# Altium footprint library Wurth_Elektronik_Electromechanic_Wire_to_Board_Connectors_rev16a.PCBLIB: 662 footprints (part 7 of 42)
Each footprint in its own frame and in the unit in brackets; x right, y up, seen from the top. Pads: shape width x height; smd on the part's side, far side on the other; paste and mask are expansions set on the pad; w line width, h text height; cw(c..) or ccw(c..) is an arc to the next point about the centre after c.
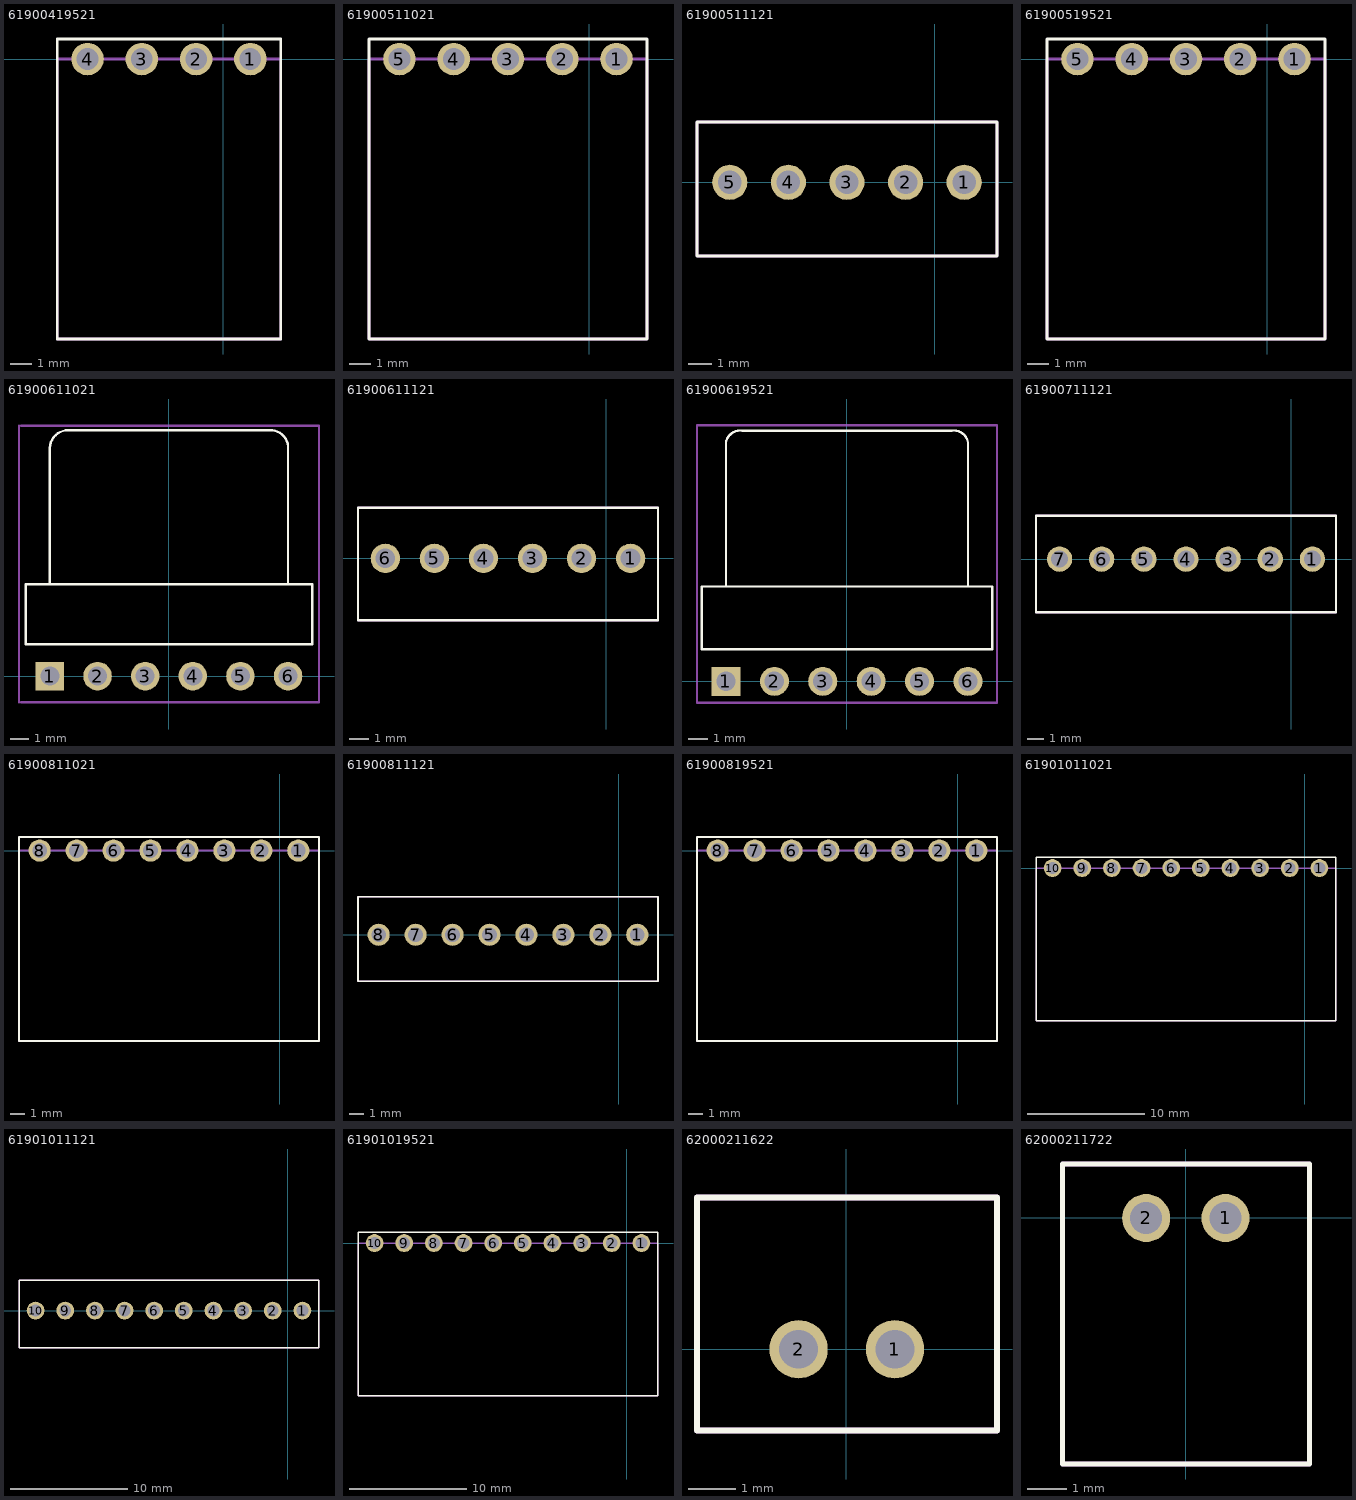
[diagram p6: the footprints below, top view; thin cyan lines are the x and y axes]

## 61900419521 [mil]
pads (4):
  round 60 hole 40: 1(50,0) 2(-50,0) 3(-150,0) 4(-250,0)
Top Overlay:
  lines w5: -305.91,-515.75 106,-515.75 106,37 -305.91,37 -305.91,-515.75
Mechanical 2:
  text ">NAME" at 189,-238.19 h77.5
Mechanical 4:
  text ">VALUE" at 198,-316.14 h77.5
Mechanical 16:
  lines w5: -305.91,-515.75 -305.91,0 106,0 106,-515.75 -305.91,-515.75
  text "1" at 25,-25 h77.5
  text "4" at -275,-25 h77.5

## 61900511021 [mil]
pads (5):
  round 60 hole 40: 1(50,0) 2(-50,0) 3(-150,0) 4(-250,0) 5(-350,0)
Top Overlay:
  lines w5: -405.91,-515.75 106,-515.75 106,37 -405.91,37 -405.91,-515.75
Mechanical 2:
  text ">NAME" at 189,-238.19 h77.5
Mechanical 4:
  text ">VALUE" at 198,-316.14 h77.5
Mechanical 16:
  lines w5: -405.91,-515.75 -405.91,0 106,0 106,-515.75 -405.91,-515.75
  text "1" at 25,-25 h77.5
  text "5" at -375,-25 h77.5

## 61900511121 [mil]
pads (5):
  round 60 hole 40: 1(50,0) 2(-50,0) 3(-150,0) 4(-250,0) 5(-350,0)
Top Overlay:
  lines w5: -405.91,-125.98 106,-125.98 106,103 -405.91,103 -405.91,-125.98
Mechanical 2:
  text ">NAME" at 139,12 h77.5
Mechanical 4:
  text ">VALUE" at 148,-66.14 h77.5
Mechanical 16:
  lines w5: -405.91,-125.98 -405.91,103 106,103 106,-125.98 -405.91,-125.98
  text "1" at 28,-23.62 h77.5
  text "5" at -370.08,-23.62 h77.5

## 61900519521 [mil]
pads (5):
  round 60 hole 40: 1(50,0) 2(-50,0) 3(-150,0) 4(-250,0) 5(-350,0)
Top Overlay:
  lines w5: -405.91,-515.75 106,-515.75 106,37 -405.91,37 -405.91,-515.75
Mechanical 2:
  text ">NAME" at 189,-238.19 h77.5
Mechanical 4:
  text ">VALUE" at 198,-316.14 h77.5
Mechanical 16:
  lines w5: -405.91,-515.75 -405.91,0 106,0 106,-515.75 -405.91,-515.75
  text "1" at 25,-25 h77.5
  text "5" at -375,-25 h77.5

## 61900611021 [mil]
pads (6):
  rect 60x60 hole 40: 1(-250,0)
  round 60 hole 40: 2(-150,0) 3(-50,0) 4(50,0) 5(150,0) 6(250,0)
Top Overlay:
  lines w5: -250,197 -250,473 cw(c-211.77,477.77) -216.54,516 217,516 cw(c214,480) 250,477 250,197 ; -300.79,67 -300.79,193 301,193 301,67 -300.79,67
Mechanical 2:
  text ">NAME" at -300.79,536 h77.5
Mechanical 4:
  text ">VALUE" at -300.79,-118.11 h77.5
Mechanical 27:
  lines w5: -314.96,-55.12 -314.96,526 ; -310.63,-55.12 315,-55.12 315,526 -310.63,526

## 61900611121 [mil]
pads (6):
  round 60 hole 40: 1(50,0) 2(-50,0) 3(-150,0) 4(-250,0) 5(-350,0) 6(-450,0)
Top Overlay:
  lines w5: -505.91,-125.98 106,-125.98 106,103 -505.91,103 -505.91,-125.98
Mechanical 2:
  text ">NAME" at 139,12 h77.5
Mechanical 4:
  text ">VALUE" at 148,-66.14 h77.5
Mechanical 16:
  lines w5: -505.91,-125.98 -505.91,103 106,103 106,-125.98 -505.91,-125.98
  text "1" at 28,-23.62 h77.5
  text "6" at -464.57,-23.62 h77.5

## 61900619521 [mil]
pads (6):
  rect 60x60 hole 40: 1(-250,0)
  round 60 hole 40: 2(-150,0) 3(-50,0) 4(50,0) 5(150,0) 6(250,0)
Top Overlay:
  lines w5: -250,197 -250,493 cw(c-220.77,488.77) -216.54,518 217,518 cw(c221,489) 250,493 250,197 ; -300,66 -300,196 300,196 300,66 -300,66
Mechanical 2:
  text ">NAME" at -300,539 h77.5
Mechanical 4:
  text ">VALUE" at -300,-110.24 h77.5
Mechanical 27:
  lines w5: -309.84,-44.09 -309.84,529 310,529 310,-44.09 -309.84,-44.09

## 61900711121 [mil]
pads (7):
  round 60 hole 40: 1(50,0) 2(-50,0) 3(-150,0) 4(-250,0) 5(-350,0) 6(-450,0) 7(-550,0)
Top Overlay:
  lines w5: -605.91,-125.98 106,-125.98 106,103 -605.91,103 -605.91,-125.98
Mechanical 2:
  text ">NAME" at 139,12 h77.5
Mechanical 4:
  text ">VALUE" at 148,-66.14 h77.5
Mechanical 16:
  lines w5: -605.91,-125.98 -605.91,103 106,103 106,-125.98 -605.91,-125.98
  text "1" at 28,-23.62 h77.5
  text "7" at -566.93,-27.56 h77.5

## 61900811021 [mil]
pads (8):
  round 60 hole 40: 1(50,0) 2(-50,0) 3(-150,0) 4(-250,0) 5(-350,0) 6(-450,0) 7(-550,0) 8(-650,0)
Top Overlay:
  lines w5: -705.91,-515.75 106,-515.75 106,37 -705.91,37 -705.91,-515.75
Mechanical 2:
  text ">NAME" at 189,-238.19 h77.5
Mechanical 4:
  text ">VALUE" at 198,-316.14 h77.5
Mechanical 16:
  lines w5: -705.91,-515.75 -705.91,0 106,0 106,-515.75 -705.91,-515.75
  text "1" at 25,-25 h77.5
  text "8" at -675,-25 h77.5

## 61900811121 [mil]
pads (8):
  round 60 hole 40: 1(50,0) 2(-50,0) 3(-150,0) 4(-250,0) 5(-350,0) 6(-450,0) 7(-550,0) 8(-650,0)
Top Overlay:
  lines w5: -705.91,-125.98 106,-125.98 106,103 -705.91,103 -705.91,-125.98
Mechanical 2:
  text ">NAME" at 139,12 h77.5
Mechanical 4:
  text ">VALUE" at 148,-66.14 h77.5
Mechanical 16:
  lines w5: -705.91,-125.98 -705.91,103 106,103 106,-125.98 -705.91,-125.98
  text "1" at 28,-23.62 h77.5
  text "8" at -673.23,-23.62 h77.5

## 61900819521 [mil]
pads (8):
  round 60 hole 40: 1(50,0) 2(-50,0) 3(-150,0) 4(-250,0) 5(-350,0) 6(-450,0) 7(-550,0) 8(-650,0)
Top Overlay:
  lines w5: -705.91,-515.75 106,-515.75 106,37 -705.91,37 -705.91,-515.75
Mechanical 2:
  text ">NAME" at 189,-238.19 h77.5
Mechanical 4:
  text ">VALUE" at 198,-316.14 h77.5
Mechanical 16:
  lines w5: -705.91,-515.75 -705.91,0 106,0 106,-515.75 -705.91,-515.75
  text "1" at 25,-25 h77.5
  text "8" at -675,-25 h77.5

## 61901011021 [mil]
pads (10):
  round 60 hole 40: 1(50,0) 2(-50,0) 3(-150,0) 4(-250,0) 5(-350,0) 6(-450,0) 7(-550,0) 8(-650,0) 9(-750,0) 10(-850,0)
Top Overlay:
  lines w5: -905.91,-515.75 106,-515.75 106,37 -905.91,37 -905.91,-515.75
Mechanical 2:
  text ">NAME" at 189,-238.19 h77.5
Mechanical 4:
  text ">VALUE" at 198,-316.14 h77.5
Mechanical 16:
  lines w5: -905.91,-515.75 -905.91,0 106,0 106,-515.75 -905.91,-515.75
  text "1" at 25,-25 h77.5
  text "10" at -900,-25 h77.5

## 61901011121 [mil]
pads (10):
  round 60 hole 40: 1(50,0) 2(-50,0) 3(-150,0) 4(-250,0) 5(-350,0) 6(-450,0) 7(-550,0) 8(-650,0) 9(-750,0) 10(-850,0)
Top Overlay:
  lines w5: -905.91,-125.98 106,-125.98 106,103 -905.91,103 -905.91,-125.98
Mechanical 2:
  text ">NAME" at 139,12 h77.5
Mechanical 4:
  text ">VALUE" at 148,-66.14 h77.5
Mechanical 16:
  lines w5: -905.91,-125.98 -905.91,103 106,103 106,-125.98 -905.91,-125.98
  text "1" at 28,-23.62 h77.5
  text "10" at -893.7,-23.62 h77.5

## 61901019521 [mil]
pads (10):
  round 60 hole 40: 1(50,0) 2(-50,0) 3(-150,0) 4(-250,0) 5(-350,0) 6(-450,0) 7(-550,0) 8(-650,0) 9(-750,0) 10(-850,0)
Top Overlay:
  lines w5: -905.91,-515.75 106,-515.75 106,37 -905.91,37 -905.91,-515.75
Mechanical 2:
  text ">NAME" at 189,-238.19 h77.5
Mechanical 4:
  text ">VALUE" at 198,-316.14 h77.5
Mechanical 16:
  lines w5: -905.91,-515.75 -905.91,0 106,0 106,-515.75 -905.91,-515.75
  text "1" at 25,-25 h77.5
  text "10" at -900,-25 h77.5

## 62000211622 [mil]
pads (2):
  round 48 hole 32: 1(40,0) 2(-39.37,0)
Top Overlay:
  lines w5: -123.03,-66.93 124,-66.93 124,125 -123.03,125 -123.03,-66.93
Mechanical 2:
  text ">NAME" at 150,-1.97 h77.5
Mechanical 4:
  text ">VALUE" at 158,-79.92 h77.5
Mechanical 16:
  lines w5: -123.03,-66.93 124,-66.93 124,125 -123.03,125 -123.03,-66.93
  text "1" at 20,-19.68 h77.5
  text "2" at -59.06,-19.68 h77.5

## 62000211722 [mil]
pads (2):
  round 48 hole 32: 1(40,0) 2(-39.37,0)
Top Overlay:
  lines w5: -123.03,-246.06 124,-246.06 124,54 -123.03,54 -123.03,-246.06
Mechanical 2:
  text ">NAME" at 150,-1.97 h77.5
Mechanical 4:
  text ">VALUE" at 158,-79.92 h77.5
Mechanical 16:
  lines w5: -123.03,-246.06 124,-246.06 124,54 -123.03,54 -123.03,-246.06
  text "1" at 20,-19.68 h77.5
  text "2" at -59.06,-19.68 h77.5